# Altium footprint library AltiumLibrary.PcbLib: 87 footprints (part 6 of 6)
Each footprint in its own frame and in the unit in brackets; x right, y up, seen from the top. Pads: shape width x height; smd on the part's side, far side on the other; paste and mask are expansions set on the pad; w line width, h text height; cw(c..) or ccw(c..) is an arc to the next point about the centre after c.
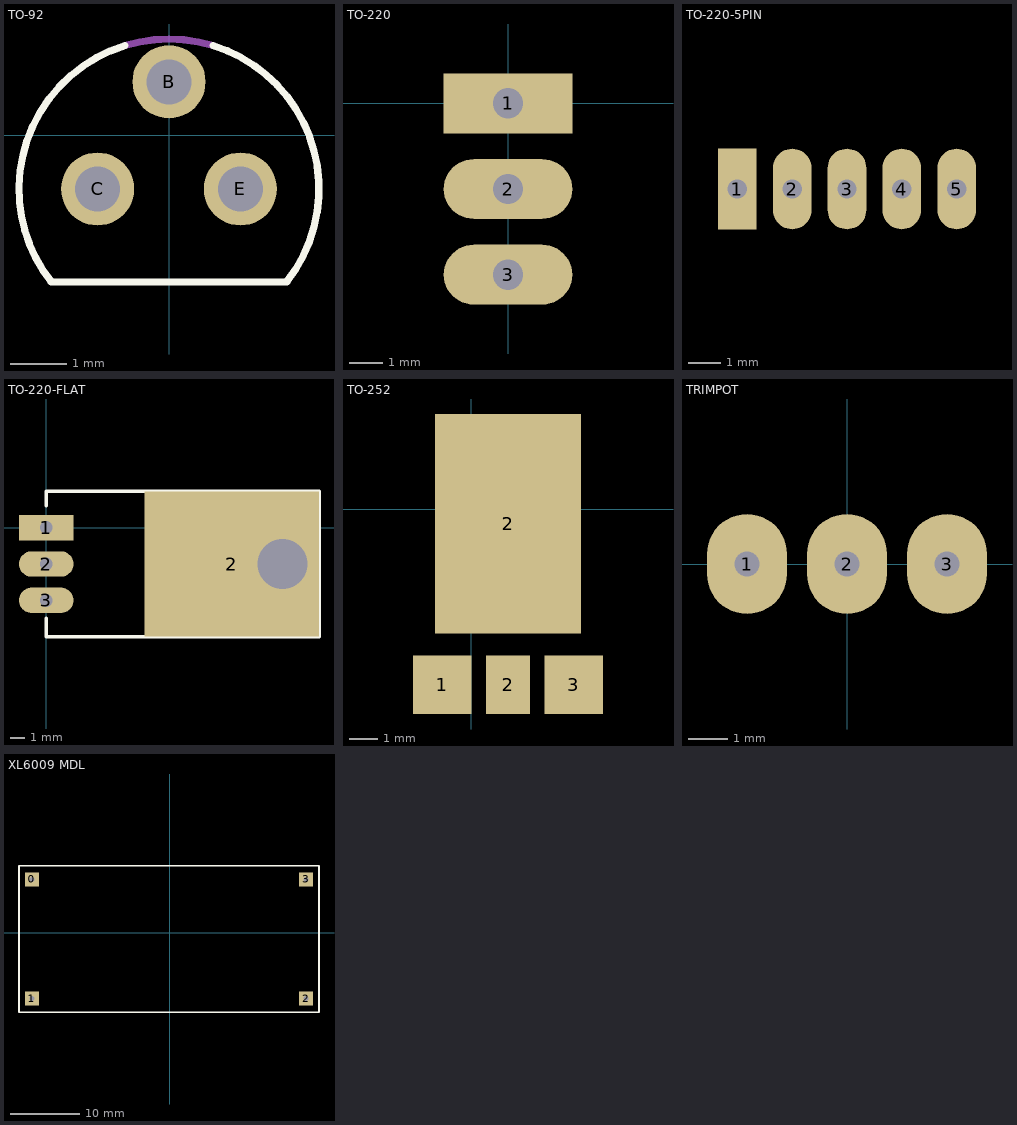
[diagram p5: the footprints below, top view; thin cyan lines are the x and y axes]

## TO-92 [mm]
pads (3):
  round 1.3 hole 0.8: B(0,0.953) C(-1.27,-0.953) E(1.27,-0.953)
Top Overlay:
  lines w0.127: -2.102,-2.595 cw(c0,-0.953) -2.657,-1.185 cw(c0,-0.952) -0.78,1.598 ; -2.094,-2.603 2.094,-2.603 ; 0.78,1.598 cw(c0,-0.953) 2.102,-2.594
Mechanical 1:
  lines w0.127: -0.78,1.598 cw(c0,-0.953) 0.78,1.598
3D body "TO-92.STEP": height 7.37, standoff -3, extent -2.415,-1.966 2.415,1.464

## TO-220 [mil]
pads (3):
  rect 150x70 hole 35.43: 1(0,0)
  oval 150x70 hole 35.43: 2(0,-100) 3(0,-200)
3D body "User Library-Transistor TO 220.step": height 661.42, standoff -354.33, extent -63.58,-305 113.58,100.51

## TO-220-5PIN [mm]
pads (5):
  rect 1.2x2.5 hole 0.6: 1(2.54,-8.128)
  oval 1.2x2.5 hole 0.6: 2(4.24,-8.128) 3(5.94,-8.128) 4(7.64,-8.128) 5(9.34,-8.128)
3D body "User Library-TO220-5T PCB.step": height 17, standoff -6.57, extent 0.88,-11.035 11,-6.578

## TO-220-FLAT [mil]
pads (5):
  rect 150x70 hole 35.43: 1(0,0)
  oval 150x70 hole 35.43: 2(0,-100) 3(0,-200)
  rect 480x400 smd: 2(510,-100)
  round 0 hole 137.8 unplated: ""(650,-100)
Top Overlay:
  lines w10: 0,-250 0,-300 750,-300 750,100 20,100 0,100 0,60
3D body "User Library-to-220.step": height 195.2, standoff -50.28, extent -4.53,-300 754.52,100

## TO-252 [mil]
pads (4):
  rect 80x80 smd: 1(-40,-240) 3(140,-240)
  rect 200x300 smd: 2(50,-20)
  rect 60x80 smd: 2(50,-240)
3D body "User Library-DPAK-1.step": height 94.98, standoff -0.1, extent -78.74,-248.77 178.74,142.5

## TRIMPOT [mil]
pads (3):
  oval 80x100 hole 25: 1(-100,0) 2(0,0) 3(100,0)
3D body "User Library-3296W.step": height 454.72, standoff -62.99, extent -187.59,-94.48 187.6,94.5

## XL6009 MDL [mil]
pads (4):
  rect 80x80 hole 27.56: 0(-782,303) 1(-782,-373) 2(772,-373) 3(772,303)
Top Overlay:
  lines w10: -855,-450 -855,380 845,380 845,-450 -855,-450
3D body "XL6009.stp": height 501.93, standoff -205.07, extent -855,-450 845,380